# Altium footprint library TelemetryFTP.PcbLib: 98 footprints (part 7 of 7)
Each footprint in its own frame and in the unit in brackets; x right, y up, seen from the top. Pads: shape width x height; smd on the part's side, far side on the other; paste and mask are expansions set on the pad; w line width, h text height; cw(c..) or ccw(c..) is an arc to the next point about the centre after c.
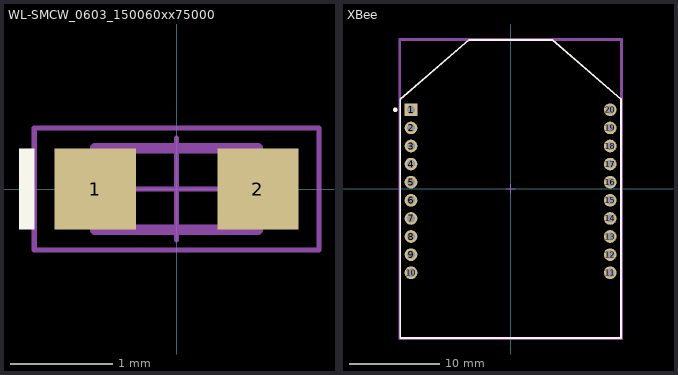
[diagram p6: the footprints below, top view; thin cyan lines are the x and y axes]

## WL-SMCW_0603_150060xx75000 [mm] "SMD Mono-color Chip LED, body 1.6x0.8mm"
height 0.7
pads (2):
  rect 0.8x0.8 smd: 1(-0.8,0) 2(0.8,0)
Top Overlay:
  rectangle: -1.55,-0.4 -1.4,0.4
Top Courtyard:
  lines w0.05: -0.5,0 0.5,0 ; 0,-0.5 0,0.5 ; -1.4,-0.6 -1.4,0.6 1.4,0.6 1.4,-0.6 -1.4,-0.6
Top Designator:
  text ".Designator" at -2.499,-0.167 h0.5
Top Component Outline:
  rectangle: -0.8,-0.4 -0.5,0.4
  lines w0.1: -0.8,-0.4 -0.8,0.4 0.8,0.4 0.8,-0.4 -0.8,-0.4
3D body "150060xxx.stp": height 0.7, standoff 0, extent -0.8,-0.4 0.8,0.4

## XBee [mm]
pads (20):
  rect 1.4x1.4 hole 0.9 paste-2539.97 mask+0: 1(-11,8.75)
  round 1.4 hole 0.9 paste-2539.97 mask+0: 2(-11,6.75) 3(-11,4.75) 4(-11,2.75) 5(-11,0.75) 6(-11,-1.25) 7(-11,-3.25) 8(-11,-5.25) 9(-11,-7.25) 10(-11,-9.25) 11(11,-9.25) 12(11,-7.25) 13(11,-5.25) 14(11,-3.25) 15(11,-1.25) 16(11,0.75) 17(11,2.75) 18(11,4.75) 19(11,6.75) 20(11,8.75)
Top Overlay:
  circle w0.25: c-12.74,8.75 r0.125
  lines w0.2: -12.19,-16.47 -12.19,9.94 -4.6,16.47 4.6,16.47 12.19,9.94 12.19,-16.47 -12.19,-16.47
Top 3D Body:
  lines w0.2: -12.19,-16.47 -12.19,16.47 12.19,16.47 12.19,-16.47 -12.19,-16.47
Top Assembly:
  lines w0.2: -12.29,-16.57 -12.29,16.57 12.29,16.57 12.29,-16.57 -12.29,-16.57
  text ".Designator" at 0,0.188 h1
Board:
  lines w0.2: -12.29,-16.57 -12.29,16.57 12.29,16.57 12.29,-16.57 -12.29,-16.57
Top Component Center:
  lines w0.1: -0.5,0 0.5,0 ; 0,-0.5 0,0.5
3D body "UNK_Digi_International_XBP9B-DMUTB002_eec.STEP": height 0.25, standoff 0, extent -12.29,-16.57 12.29,16.57